# Altium footprint library Intelliclone.PcbLib: 372 footprints (part 16 of 24)
Each footprint in its own frame and in the unit in brackets; x right, y up, seen from the top. Pads: shape width x height; smd on the part's side, far side on the other; paste and mask are expansions set on the pad; w line width, h text height; cw(c..) or ccw(c..) is an arc to the next point about the centre after c.
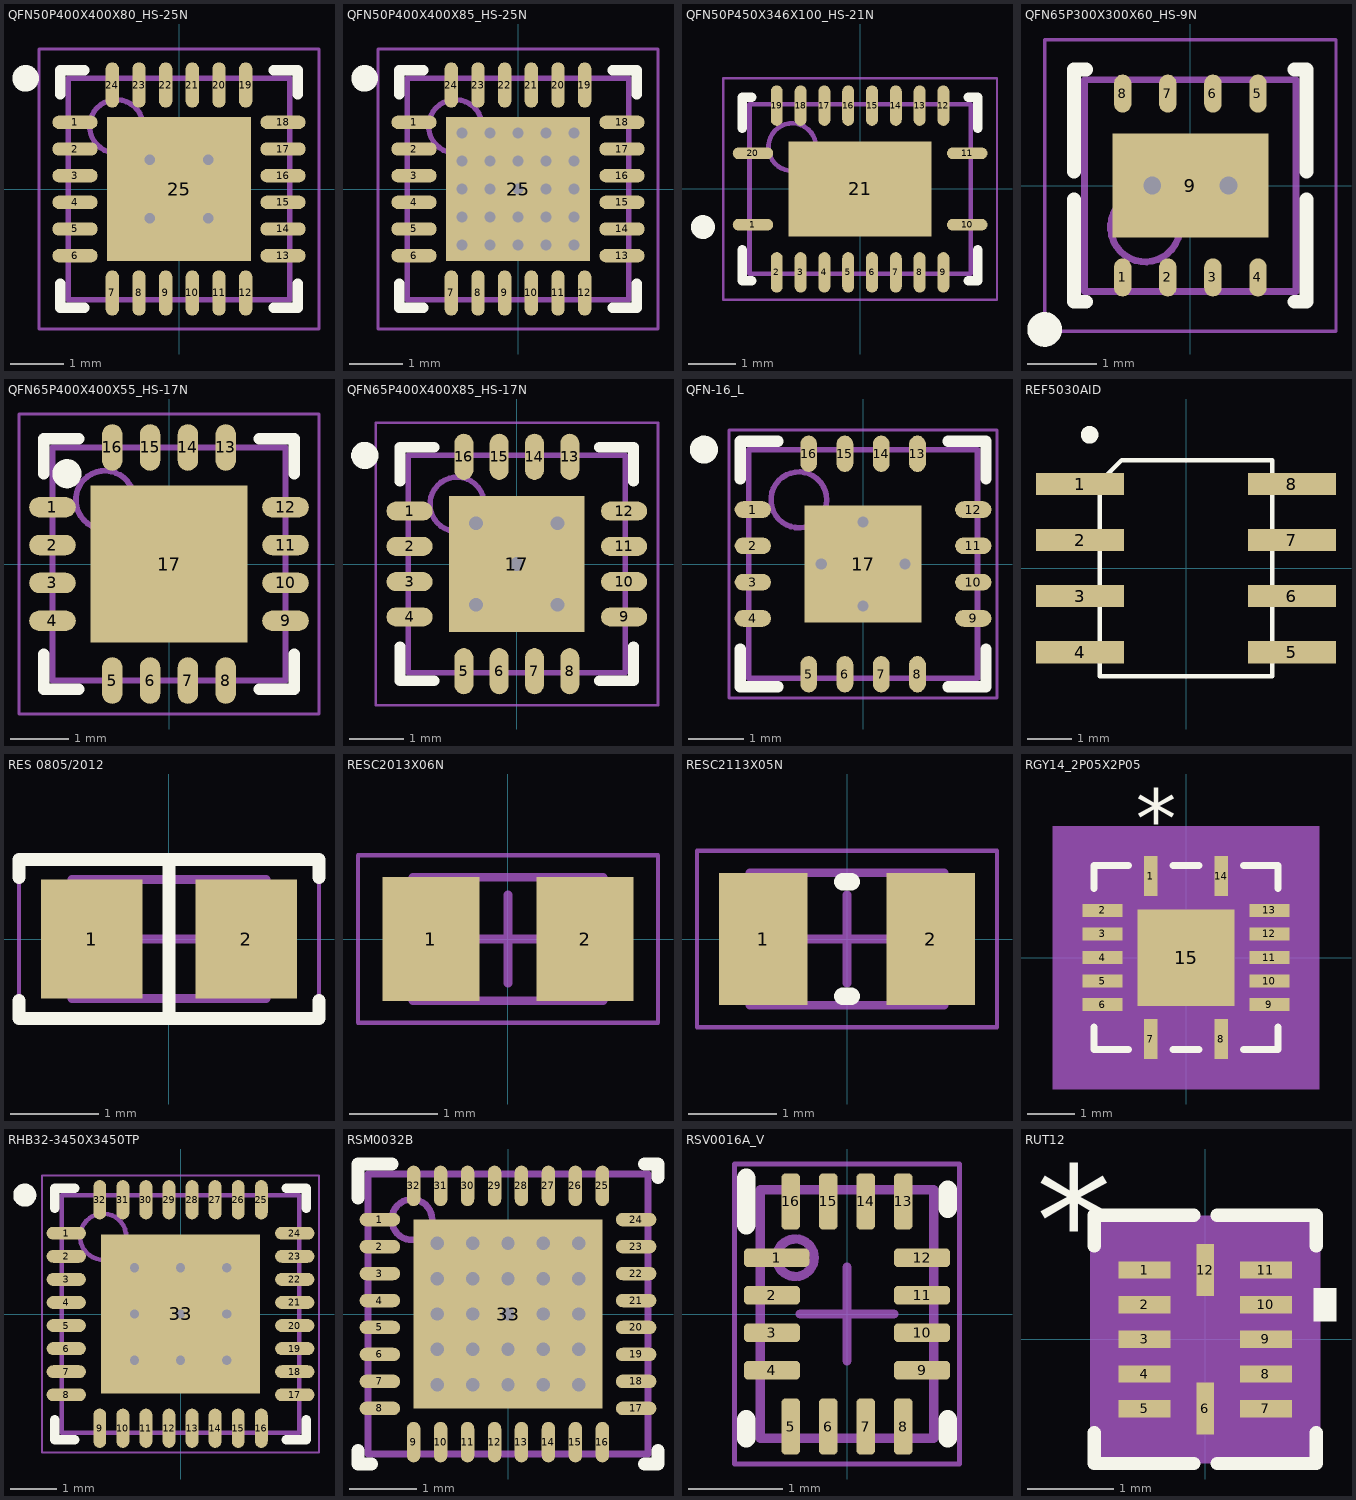
[diagram p15: the footprints below, top view; thin cyan lines are the x and y axes]

## QFN50P400X400X80_HS-25N [mm] "QFN, 24-Leads, Body 4.00x4.00mm, Pitch 0.50mm, Thermal Pad 2.70x2.70mm, IPC Medium Density"
height 0.8
pads (25):
  oval 0.85x0.25 smd: 1(-1.95,1.25) 2(-1.95,0.75) 3(-1.95,0.25) 4(-1.95,-0.25) 5(-1.95,-0.75) 6(-1.95,-1.25) 13(1.95,-1.25) 14(1.95,-0.75) 15(1.95,-0.25) 16(1.95,0.25) 17(1.95,0.75) 18(1.95,1.25)
  oval 0.25x0.85 smd: 7(-1.25,-1.95) 8(-0.75,-1.95) 9(-0.25,-1.95) 10(0.25,-1.95) 11(0.75,-1.95) 12(1.25,-1.95) 19(1.25,1.95) 20(0.75,1.95) 21(0.25,1.95) 22(-0.25,1.95) 23(-0.75,1.95) 24(-1.25,1.95)
  rect 2.7x2.7 smd: 25(0,0)
via 0.55,-0.55 diameter 0.5 hole 0.2
via -0.55,-0.55 diameter 0.5 hole 0.2
via 0.55,0.55 diameter 0.5 hole 0.2
via -0.55,0.55 diameter 0.5 hole 0.2
Top Overlay:
  circle w0.25: c-2.875,2.075 r0.125
  lines w0.2: -2.225,-1.775 -2.225,-2.225 -1.775,-2.225 ; -2.225,1.775 -2.225,2.225 -1.775,2.225 ; 1.775,-2.225 2.225,-2.225 2.225,-1.775 ; 1.775,2.225 2.225,2.225 2.225,1.775
Mechanical 13:
  circle w0.1: c-1.175,1.175 r0.5
  lines w0.1: -2.075,-2.075 2.075,-2.075 2.075,2.075 -2.075,2.075 -2.075,-2.075
Mechanical 15:
  lines w0.05: -2.625,-2.625 2.625,-2.625 2.625,2.625 -2.625,2.625 -2.625,-2.625
  lines w0.1: -0.5,0 0.5,0 ; 0,-0.5 0,0.5
3D body "QFN50P400X400X80_HS-25N.step": height 0.8, standoff 0, extent -2.175,-2.175 2.175,2.175

## QFN50P400X400X85_HS-25N [mm] "QFN, 24-Leads, Body 4.00x4.00mm, Pitch 0.50mm, Thermal Pad 2.70x2.70mm, IPC Medium Density"
height 0.85
pads (25):
  oval 0.85x0.25 smd: 1(-1.95,1.25) 2(-1.95,0.75) 3(-1.95,0.25) 4(-1.95,-0.25) 5(-1.95,-0.75) 6(-1.95,-1.25) 13(1.95,-1.25) 14(1.95,-0.75) 15(1.95,-0.25) 16(1.95,0.25) 17(1.95,0.75) 18(1.95,1.25)
  oval 0.25x0.85 smd: 7(-1.25,-1.95) 8(-0.75,-1.95) 9(-0.25,-1.95) 10(0.25,-1.95) 11(0.75,-1.95) 12(1.25,-1.95) 19(1.25,1.95) 20(0.75,1.95) 21(0.25,1.95) 22(-0.25,1.95) 23(-0.75,1.95) 24(-1.25,1.95)
  rect 2.7x2.7 smd: 25(0,0)
via 0,0 diameter 0.5 hole 0.2
via 0,0.525 diameter 0.5 hole 0.2
via 0,1.05 diameter 0.5 hole 0.2
via 0,-1.05 diameter 0.5 hole 0.2
via 0,-0.525 diameter 0.5 hole 0.2
via -0.525,-0.525 diameter 0.5 hole 0.2
via -0.525,-1.05 diameter 0.5 hole 0.2
via -0.525,1.05 diameter 0.5 hole 0.2
via -0.525,0.525 diameter 0.5 hole 0.2
via -0.525,0 diameter 0.5 hole 0.2
via -1.05,-0.525 diameter 0.5 hole 0.2
via -1.05,-1.05 diameter 0.5 hole 0.2
via -1.05,1.05 diameter 0.5 hole 0.2
via -1.05,0.525 diameter 0.5 hole 0.2
via -1.05,0 diameter 0.5 hole 0.2
via 0.525,-0.525 diameter 0.5 hole 0.2
via 0.525,-1.05 diameter 0.5 hole 0.2
via 0.525,1.05 diameter 0.5 hole 0.2
via 0.525,0.525 diameter 0.5 hole 0.2
via 0.525,0 diameter 0.5 hole 0.2
via 1.05,-0.525 diameter 0.5 hole 0.2
via 1.05,-1.05 diameter 0.5 hole 0.2
via 1.05,1.05 diameter 0.5 hole 0.2
via 1.05,0.525 diameter 0.5 hole 0.2
via 1.05,0 diameter 0.5 hole 0.2
Top Overlay:
  circle w0.25: c-2.875,2.075 r0.125
  lines w0.2: -2.225,-1.775 -2.225,-2.225 -1.775,-2.225 ; -2.225,1.775 -2.225,2.225 -1.775,2.225 ; 1.775,-2.225 2.225,-2.225 2.225,-1.775 ; 1.775,2.225 2.225,2.225 2.225,1.775
Mechanical 13:
  circle w0.1: c-1.175,1.175 r0.5
  lines w0.1: -2.075,-2.075 -2.075,2.075 2.075,2.075 2.075,-2.075 -2.075,-2.075
Mechanical 15:
  lines w0.05: -2.625,-2.625 -2.625,2.625 2.625,2.625 2.625,-2.625 -2.625,-2.625
  lines w0.1: -1.05,-0.5 -1.05,0.5 ; -0.525,-0.5 -0.525,0.5 ; -0.5,0 0.5,0 ; 0,-0.5 0,0.5 ; 0.525,-0.5 0.525,0.5 ; 1.05,-0.5 1.05,0.5
3D body "QFN50P400X400X85_HS-25N.step": height 0.85, standoff 0, extent -2.155,-2.155 2.155,2.155

## QFN50P450X346X100_HS-21N [mm] "QFN, 20-Leads, Body 4.50x3.46mm, Pitch 0.50mm/1.50mm, Thermal Pad 1.60x1.60mm, IPC Medium Density"
height 1
pads (21):
  oval 0.85x0.25 smd: 1(-2.25,-0.75) 10(2.25,-0.75) 11(2.25,0.75) 20(-2.25,0.75)
  oval 0.25x0.85 smd: 2(-1.75,-1.75) 3(-1.25,-1.75) 4(-0.75,-1.75) 5(-0.25,-1.75) 6(0.25,-1.75) 7(0.75,-1.75) 8(1.25,-1.75) 9(1.75,-1.75) 12(1.75,1.75) 13(1.25,1.75) 14(0.75,1.75) 15(0.25,1.75) 16(-0.25,1.75) 17(-0.75,1.75) 18(-1.25,1.75) 19(-1.75,1.75)
  rect 3x2 smd: 21(0,0)
Top Overlay:
  circle w0.25: c-3.3,-0.8 r0.125
  lines w0.2: -2.475,-1.275 -2.475,-1.93 -2.275,-1.93 ; -2.475,1.275 -2.475,1.93 -2.275,1.93 ; 2.275,-1.93 2.475,-1.93 2.475,-1.275 ; 2.275,1.93 2.475,1.93 2.475,1.275
Mechanical 13:
  circle w0.1: c-1.425,0.88 r0.5
  lines w0.1: -2.325,-1.78 2.325,-1.78 2.325,1.78 -2.325,1.78 -2.325,-1.78
Mechanical 15:
  lines w0.05: -2.875,-2.325 2.875,-2.325 2.875,2.325 -2.875,2.325 -2.875,-2.325
  lines w0.1: -0.5,0 0.5,0 ; 0,-0.5 0,0.5
3D body: height 1, standoff 0.08, extent -2.325,-1.78 2.325,1.78

## QFN65P300X300X60_HS-9N [mm] "QFN, 8-Leads, Body 3.00x3.00mm, Pitch 0.65mm, Thermal Pad 1.50x2.25mm, IPC Medium Density"
height 0.6
pads (9):
  oval 0.25x0.55 smd: 1(-0.975,-1.325) 2(-0.325,-1.325) 3(0.325,-1.325) 4(0.975,-1.325) 5(0.975,1.325) 6(0.325,1.325) 7(-0.325,1.325) 8(-0.975,1.325)
  rect 2.25x1.5 smd: 9(0,0)
via -0.55,0 diameter 0.559 hole 0.254
via 0.55,0 diameter 0.559 hole 0.254
Top Overlay:
  circle w0.25: c-2.1,-2.075 r0.125
  lines w0.2: -1.675,-0.2 -1.675,-1.675 -1.5,-1.675 ; -1.675,0.2 -1.675,1.675 -1.5,1.675 ; 1.5,-1.675 1.675,-1.675 1.675,-0.2 ; 1.5,1.675 1.675,1.675 1.675,0.2
Mechanical 13:
  circle w0.1: c-0.65,-0.6 r0.5
  lines w0.1: -1.525,-1.525 -1.525,1.525 1.525,1.525 1.525,-1.525 -1.525,-1.525
Mechanical 15:
  lines w0.05: -2.1,-2.1 -2.1,2.1 2.1,2.1 2.1,-2.1 -2.1,-2.1
  lines w0.1: -0.5,0 0.5,0 ; 0,-0.5 0,0.5
3D body: height 0.6, standoff 0.05, extent -1.525,-1.525 1.525,1.525

## QFN65P400X400X55_HS-17N [mm] "QFN, 16-Leads, Body 4.00x4.00mm, Pitch 0.65mm, Thermal Pad 2.70x2.70mm, IPC Medium Density"
height 0.55
pads (17):
  oval 0.8x0.35 smd: 1(-2,0.975) 2(-2,0.325) 3(-2,-0.325) 4(-2,-0.975) 9(2,-0.975) 10(2,-0.325) 11(2,0.325) 12(2,0.975)
  oval 0.35x0.8 smd: 5(-0.975,-2) 6(-0.325,-2) 7(0.325,-2) 8(0.975,-2) 13(0.975,2) 14(0.325,2) 15(-0.325,2) 16(-0.975,2)
  rect 2.7x2.7 smd: 17(0,0)
Top Overlay:
  circle w0.25: c-1.75,1.55 r0.125
  lines w0.2: -2.15,-1.55 -2.15,-2.15 -1.55,-2.15 ; -2.15,1.55 -2.15,2.15 -1.55,2.15 ; 1.55,-2.15 2.15,-2.15 2.15,-1.55 ; 1.55,2.15 2.15,2.15 2.15,1.55
Mechanical 13:
  circle w0.1: c-1.1,1.1 r0.5
  lines w0.1: -2,-2 2,-2 2,2 -2,2 -2,-2
Mechanical 15:
  lines w0.05: -2.575,-2.575 2.575,-2.575 2.575,2.575 -2.575,2.575 -2.575,-2.575
  lines w0.1: -0.5,0 0.5,0 ; 0,-0.5 0,0.5
3D body "QFN65P400X400X55_HS-17N.step": height 0.55, standoff 0, extent -2.05,-2.05 2.05,2.05

## QFN65P400X400X85_HS-17N [mm] "QFN, 16-Leads, Body 4.00x4.00mm, Pitch 0.65mm, Thermal Pad 2.08x2.08mm, IPC Medium Density"
height 0.85
pads (17):
  oval 0.85x0.35 smd: 1(-1.975,0.975) 2(-1.975,0.325) 3(-1.975,-0.325) 4(-1.975,-0.975) 9(1.975,-0.975) 10(1.975,-0.325) 11(1.975,0.325) 12(1.975,0.975)
  oval 0.35x0.85 smd: 5(-0.975,-1.975) 6(-0.325,-1.975) 7(0.325,-1.975) 8(0.975,-1.975) 13(0.975,1.975) 14(0.325,1.975) 15(-0.325,1.975) 16(-0.975,1.975)
  rect 2.5x2.5 smd paste-1.25: 17(0,0)
via 0,0 diameter 0.559 hole 0.254
via -0.75,0.75 diameter 0.559 hole 0.254
via 0.75,0.75 diameter 0.559 hole 0.254
via -0.75,-0.75 diameter 0.559 hole 0.254
via 0.75,-0.75 diameter 0.559 hole 0.254
Top Overlay:
  circle w0.25: c-2.8,2 r0.125
  lines w0.2: -2.15,-1.525 -2.15,-2.15 -1.525,-2.15 ; -2.15,1.525 -2.15,2.15 -1.525,2.15 ; 1.525,-2.15 2.15,-2.15 2.15,-1.525 ; 1.525,2.15 2.15,2.15 2.15,1.525
Top Paste:
  rectangle: -1.125,-1.1 -0.125,-0.1
  rectangle: 0.1,-1.1 1.1,-0.1
  rectangle: 0.1,0.1 1.1,1.1
  rectangle: -1.125,0.1 -0.125,1.1
Mechanical 13:
  circle w0.1: c-1.1,1.1 r0.5
  lines w0.1: -2,-2 -2,2 2,2 2,-2 -2,-2
Mechanical 15:
  lines w0.05: -2.6,-2.6 -2.6,2.6 2.6,2.6 2.6,-2.6 -2.6,-2.6
  lines w0.1: -0.5,0 0.5,0 ; 0,-0.5 0,0.5
3D body: height 0.85, standoff 0.05, extent -2,-2 2,2

## QFN-16_L [mm] "QFN, 16-Leads, Body 4x4mm, Pitch 0.65mm, Thermal Pad 2.1x2.1mm, IPC High Density"
height 0.8
pads (17):
  oval 0.65x0.3 smd: 1(-1.975,0.975) 2(-1.975,0.325) 3(-1.975,-0.325) 4(-1.975,-0.975) 9(1.975,-0.975) 10(1.975,-0.325) 11(1.975,0.325) 12(1.975,0.975)
  oval 0.3x0.65 smd: 5(-0.975,-1.975) 6(-0.325,-1.975) 7(0.325,-1.975) 8(0.975,-1.975) 13(0.975,1.975) 14(0.325,1.975) 15(-0.325,1.975) 16(-0.975,1.975)
  rect 2.1x2.1 smd paste-1.05: 17(0,0)
via 0.75,0 diameter 0.5 hole 0.2
via -0.75,0 diameter 0.5 hole 0.2
via 0,0.75 diameter 0.5 hole 0.2
via 0,-0.75 diameter 0.5 hole 0.2
Top Overlay:
  circle w0.25: c-2.85,2.05 r0.125
  lines w0.2: -2.2,-1.525 -2.2,-2.2 -1.525,-2.2 ; -2.2,1.525 -2.2,2.2 -1.525,2.2 ; 1.525,-2.2 2.2,-2.2 2.2,-1.525 ; 1.525,2.2 2.2,2.2 2.2,1.525
Top Paste:
  rectangle: -0.95,-0.95 0.95,0.95
Mechanical 13:
  circle w0.1: c-1.15,1.15 r0.5
  lines w0.1: -2.05,-2.05 2.05,-2.05 2.05,2.05 -2.05,2.05 -2.05,-2.05
Mechanical 15:
  lines w0.05: -2.4,-2.4 2.4,-2.4 2.4,2.4 -2.4,2.4 -2.4,-2.4
  lines w0.1: -0.5,0 0.5,0 ; 0,-0.5 0,0.5
3D body: height 0.8, standoff 0, extent -2.05,-2.05 2.05,2.05

## REF5030AID [mil]
pads (8):
  rect 78.7x19.7 smd: 1(-94.5,75) 2(-94.5,25) 3(-94.5,-25) 4(-94.5,-75) 5(94.5,-75) 6(94.5,-25) 7(94.5,25) 8(94.5,75)
Top Overlay:
  circle w10: c-86,119 r2.83
  lines w4.02: -77,-96.5 -77,76.8 -57.3,96.5 77,96.5 77,-96.5 -77,-96.5
3D body: height 57, standoff 4, extent -77,-97 77,97

## RES 0805/2012 [mm] "Chip Resistor, 2-Leads, Body 2.00x1.25mm, IPC Medium Density"
height 0.7
pads (2):
  rect 1.15x1.35 smd: 1(-0.875,0) 2(0.875,0)
Top Overlay:
  lines w0.15: -1.7,-0.7 -1.7,-0.9 1.7,-0.9 1.7,-0.7 ; -1.7,0.7 -1.7,0.9 1.7,0.9 1.7,0.7 ; 0,-0.9 0,0.9
Mechanical 13:
  lines w0.1: -1.1,-0.675 -1.1,0.675 1.1,0.675 1.1,-0.675 -1.1,-0.675
Mechanical 15:
  lines w0.05: -1.7,-0.95 -1.7,0.95 1.7,0.95 1.7,-0.95 -1.7,-0.95
  lines w0.1: -0.5,0 0.5,0 ; 0,-0.5 0,0.5
3D body "0805 resistor.STEP": height 0.6, standoff 0, extent -0.95,-0.625 1.05,0.625

## RESC2013X06N [mm] "Chip Resistor, 2-Leads, Body 2.00x1.27mm, IPC Medium Density"
height 0.65
pads (2):
  rect 1.1x1.4 smd: 1(-0.875,0) 2(0.875,0)
Mechanical 13:
  lines w0.1: -1.075,-0.7 -1.075,0.7 1.075,0.7 1.075,-0.7 -1.075,-0.7
Mechanical 15:
  lines w0.05: -1.7,-0.95 -1.7,0.95 1.7,0.95 1.7,-0.95 -1.7,-0.95
  lines w0.1: -0.5,0 0.5,0 ; 0,-0.5 0,0.5
3D body "RESC2013X06N.step": height 0.65, standoff 0, extent -1.075,-0.7 1.075,0.7

## RESC2113X05N [mm] "Chip Resistor, 2-Leads, Body 2.10x1.35mm, IPC Medium Density"
height 0.5
pads (2):
  rect 1x1.5 smd: 1(-0.95,0) 2(0.95,0)
Top Overlay:
  lines w0.2: -0.05,-0.65 0.05,-0.65 ; -0.05,0.65 0.05,0.65
Mechanical 13:
  lines w0.1: -1.1,-0.75 1.1,-0.75 1.1,0.75 -1.1,0.75 -1.1,-0.75
Mechanical 15:
  lines w0.05: -1.7,-1 1.7,-1 1.7,1 -1.7,1 -1.7,-1
  lines w0.1: -0.5,0 0.5,0 ; 0,-0.5 0,0.5
3D body: height 0.5, standoff 0, extent 0.72,-0.75 1.1,0.75
3D body: height 0.5, standoff 0, extent -1.1,-0.75 -0.72,0.75
3D body: height 0.5, standoff 0, extent -0.72,-0.75 0.72,0.75

## RGY14_2P05X2P05 [mm] "14-VQFN"
pads (15):
  rect 0.28x0.85 smd: 1(-0.75,1.731) 7(-0.75,-1.731) 8(0.75,-1.731) 14(0.75,1.731)
  rect 0.85x0.28 smd: 2(-1.769,1) 3(-1.769,0.5) 4(-1.769,0) 5(-1.769,-0.5) 6(-1.769,-1) 9(1.769,-1) 10(1.769,-0.5) 11(1.769,0) 12(1.769,0.5) 13(1.769,1)
  rect 2.05x2.05 smd: 15(0,0)
Top Overlay:
  lines w0.152: -1.952,-1.473 -1.952,-1.952 -1.223,-1.952 ; -1.952,1.473 -1.952,1.952 -1.223,1.952 ; -0.277,-1.952 0.277,-1.952 ; -0.277,1.952 0.277,1.952 ; 1.223,-1.952 1.952,-1.952 1.952,-1.473 ; 1.223,1.952 1.952,1.952 1.952,1.473
  text "*" at -1.068,2.308 h1.27
Top Paste:
  region: 0.95,-0.494 0.635,-0.494 0.494,-0.635 0.494,-0.95 0.95,-0.95
  region: 0.95,0.294 0.635,0.294 0.494,0.152 0.494,-0.152 0.635,-0.294 0.95,-0.294
  region: 0.95,0.95 0.494,0.95 0.494,0.635 0.635,0.494 0.95,0.494
  region: 0.152,-0.494 -0.152,-0.494 -0.294,-0.635 -0.294,-0.95 0.294,-0.95 0.294,-0.635
  region: 0.95,0.95 -0.95,0.95 -0.95,-0.95 0.95,-0.95
  region: 0.294,0.95 -0.294,0.95 -0.294,0.635 -0.152,0.494 0.152,0.494 0.294,0.635
  region: -0.635,-0.494 -0.95,-0.494 -0.95,-0.95 -0.494,-0.95 -0.494,-0.635
  region: -0.635,0.294 -0.95,0.294 -0.95,-0.294 -0.635,-0.294 -0.494,-0.152 -0.494,0.152
  region: -0.494,0.95 -0.95,0.95 -0.95,0.494 -0.635,0.494 -0.494,0.635
  region: 0,-1.025
  region: 0,-1.025
  region: 0,1.025
  region: 0,1.025
  region: -0.661,2.105 -0.839,2.105 -0.839,1.357 -0.661,1.357
  region: 0.839,2.105 0.661,2.105 0.661,1.357 0.839,1.357
  region: 2.143,1.089 1.395,1.089 1.395,0.911 2.143,0.911
  region: 2.143,0.589 1.395,0.589 1.395,0.411 2.143,0.411
  region: 2.143,0.089 1.395,0.089 1.395,-0.089 2.143,-0.089
  region: 2.143,-0.411 1.395,-0.411 1.395,-0.589 2.143,-0.589
  region: 2.143,-0.911 1.395,-0.911 1.395,-1.089 2.143,-1.089
  region: 0.839,-1.357 0.661,-1.357 0.661,-2.105 0.839,-2.105
  region: -0.661,-1.357 -0.839,-1.357 -0.839,-2.105 -0.661,-2.105
  region: -1.395,-0.911 -2.143,-0.911 -2.143,-1.089 -1.395,-1.089
  region: -1.395,-0.411 -2.143,-0.411 -2.143,-0.589 -1.395,-0.589
  region: -1.395,0.089 -2.143,0.089 -2.143,-0.089 -1.395,-0.089
  region: -1.395,0.589 -2.143,0.589 -2.143,0.411 -1.395,0.411
  region: -1.395,1.089 -2.143,1.089 -2.143,0.911 -1.395,0.911
Top Solder:
  region: 0.594,-1.088 0.594,1.088 1.088,1.088 1.088,-1.088
  region: 1.088,-1.089 1.088,1.088 -1.089,1.088 -1.089,-1.088
  region: -1.088,-1.088 -1.088,1.088 -0.594,1.088 -0.594,-1.088
  region: -1.088,-1.088 -1.088,-0.594 1.088,-0.594 1.088,-1.088
  region: -1.088,-0.194 -1.088,0.194 1.088,0.194 1.088,-0.194
  region: -1.088,0.594 -1.088,1.088 1.088,1.088 1.088,0.594
  region: 0,-1.025
  region: 0,-1.025
  region: 0,1.025
  region: 0,1.025
  region: -0.54,2.226 -0.96,2.226 -0.96,1.236 -0.54,1.236
  region: 0.96,2.226 0.54,2.226 0.54,1.236 0.96,1.236
  region: 2.264,1.21 1.274,1.21 1.274,0.79 2.264,0.79
  region: 2.264,0.71 1.274,0.71 1.274,0.29 2.264,0.29
  region: 2.264,0.21 1.274,0.21 1.274,-0.21 2.264,-0.21
  region: 2.264,-0.29 1.274,-0.29 1.274,-0.71 2.264,-0.71
  region: 2.264,-0.79 1.274,-0.79 1.274,-1.21 2.264,-1.21
  region: 0.96,-1.236 0.54,-1.236 0.54,-2.226 0.96,-2.226
  region: -0.54,-1.236 -0.96,-1.236 -0.96,-2.226 -0.54,-2.226
  region: -1.274,-0.79 -2.264,-0.79 -2.264,-1.21 -1.274,-1.21
  region: -1.274,-0.29 -2.264,-0.29 -2.264,-0.71 -1.274,-0.71
  region: -1.274,0.21 -2.264,0.21 -2.264,-0.21 -1.274,-0.21
  region: -1.274,0.71 -2.264,0.71 -2.264,0.29 -1.274,0.29
  region: -1.274,1.21 -2.264,1.21 -2.264,0.79 -1.274,0.79
Mechanical 5:
  region: 2.829,-2.791 -2.829,-2.791 -2.829,2.791 2.829,2.791
Mechanical 13:
  lines w0.025: -1.825,0.555 -0.555,1.825 ; -1.825,-1.825 -1.825,1.825 1.825,1.825 1.825,-1.825 -1.825,-1.825
  text "*" at -1.068,0.671 h1.27
Mechanical 15:
  region: 2.448,-2.41 -2.448,-2.41 -2.448,2.41 2.448,2.41
  lines w0.152: -2.448,-2.41 2.448,-2.41 2.448,2.41 -2.448,2.41 -2.448,-2.41
Mechanical 16:
  circle w0.127: c0.394,0.394 r0.191
  circle w0.127: c0.394,-0.394 r0.191
  circle w0.127: c-0.394,0.394 r0.191
  circle w0.127: c-0.394,-0.394 r0.191
3D body "RGY14_2P05X2P05.step": height 1, standoff 0, extent -1.876,-1.876 1.876,1.876
3D body: height 0.25, standoff 0, extent 0,0 0.254,0.254

## RHB32-3450X3450TP [mm] "QFN, 32-Leads, Body 5x5mm, Pitch 0.5mm, Thermal Pad 3.45x3.45mm, TI Recommended"
height 1
pads (33):
  oval 0.85x0.28 smd paste-0.025 mask+0.07: 1(-2.475,1.75) 2(-2.475,1.25) 3(-2.475,0.75) 4(-2.475,0.25) 5(-2.475,-0.25) 6(-2.475,-0.75) 7(-2.475,-1.25) 8(-2.475,-1.75) 17(2.475,-1.75) 18(2.475,-1.25) 19(2.475,-0.75) 20(2.475,-0.25) 21(2.475,0.25) 22(2.475,0.75) 23(2.475,1.25) 24(2.475,1.75)
  oval 0.28x0.85 smd paste-0.025 mask+0.07: 9(-1.75,-2.475) 10(-1.25,-2.475) 11(-0.75,-2.475) 12(-0.25,-2.475) 13(0.25,-2.475) 14(0.75,-2.475) 15(1.25,-2.475) 16(1.75,-2.475) 25(1.75,2.475) 26(1.25,2.475) 27(0.75,2.475) 28(0.25,2.475) 29(-0.25,2.475) 30(-0.75,2.475) 31(-1.25,2.475) 32(-1.75,2.475)
  rect 3.45x3.45 smd paste-1.725 mask+0.07: 33(0,0)
via 1,-1 diameter 0.5 hole 0.2
via 0,-1 diameter 0.5 hole 0.2
via -1,-1 diameter 0.5 hole 0.2
via 1,0 diameter 0.5 hole 0.2
via 0,0 diameter 0.5 hole 0.2
via -1,0 diameter 0.5 hole 0.2
via 1,1 diameter 0.5 hole 0.2
via 0,1 diameter 0.5 hole 0.2
via -1,1 diameter 0.5 hole 0.2
Top Overlay:
  circle w0.25: c-3.375,2.575 r0.125
  lines w0.2: -2.725,-2.29 -2.725,-2.725 -2.29,-2.725 ; -2.725,2.29 -2.725,2.725 -2.29,2.725 ; 2.29,-2.725 2.725,-2.725 2.725,-2.29 ; 2.29,2.725 2.725,2.725 2.725,2.29
Top Paste:
  region: -0.15,-0.15 -1.6,-0.15 -1.6,-1.6 -0.15,-1.6
  rectangle: 0.15,-1.6 1.6,-0.15
  rectangle: 0.15,0.15 1.6,1.6
  region: -0.15,1.6 -1.6,1.6 -1.6,0.15 -0.15,0.15
Mechanical 13:
  circle w0.1: c-1.675,1.675 r0.5
  lines w0.1: -2.575,-2.575 2.575,-2.575 2.575,2.575 -2.575,2.575 -2.575,-2.575
Mechanical 15:
  lines w0.05: -3,-3 3,-3 3,3 -3,3 -3,-3
  lines w0.1: -0.5,0 0.5,0 ; 0,-0.5 0,0.5
3D body: height 1, standoff 0, extent -2.575,-2.575 2.575,2.575

## RSM0032B [mm]
height 1
pads (33):
  oval 0.6x0.2 smd paste+0 mask+0.051: 1(-1.9,1.4) 2(-1.9,1) 3(-1.9,0.6) 4(-1.9,0.2) 5(-1.9,-0.2) 6(-1.9,-0.6) 7(-1.9,-1) 8(-1.9,-1.4) 17(1.9,-1.4) 18(1.9,-1) 19(1.9,-0.6) 20(1.9,-0.2) 21(1.9,0.2) 22(1.9,0.6) 23(1.9,1) 24(1.9,1.4)
  oval 0.2x0.6 smd paste+0 mask+0.051: 9(-1.4,-1.9) 10(-1,-1.9) 11(-0.6,-1.9) 12(-0.2,-1.9) 13(0.2,-1.9) 14(0.6,-1.9) 15(1,-1.9) 16(1.4,-1.9) 25(1.4,1.9) 26(1,1.9) 27(0.6,1.9) 28(0.2,1.9) 29(-0.2,1.9) 30(-0.6,1.9) 31(-1,1.9) 32(-1.4,1.9)
  rect 2.8x2.8 smd paste-1.387 mask+0.051: 33(0,0)
via 1.05,0 diameter 0.5 hole 0.2
via 1.05,0.525 diameter 0.5 hole 0.2
via 1.05,1.05 diameter 0.5 hole 0.2
via 1.05,-1.05 diameter 0.5 hole 0.2
via 1.05,-0.525 diameter 0.5 hole 0.2
via 0.525,0 diameter 0.5 hole 0.2
via 0.525,0.525 diameter 0.5 hole 0.2
via 0.525,1.05 diameter 0.5 hole 0.2
via 0.525,-1.05 diameter 0.5 hole 0.2
via 0.525,-0.525 diameter 0.5 hole 0.2
via -1.05,0 diameter 0.5 hole 0.2
via -1.05,0.525 diameter 0.5 hole 0.2
via -1.05,1.05 diameter 0.5 hole 0.2
via -1.05,-1.05 diameter 0.5 hole 0.2
via -1.05,-0.525 diameter 0.5 hole 0.2
via -0.525,0 diameter 0.5 hole 0.2
via -0.525,0.525 diameter 0.5 hole 0.2
via -0.525,1.05 diameter 0.5 hole 0.2
via -0.525,-1.05 diameter 0.5 hole 0.2
via -0.525,-0.525 diameter 0.5 hole 0.2
via 0,-0.525 diameter 0.5 hole 0.2
via 0,-1.05 diameter 0.5 hole 0.2
via 0,1.05 diameter 0.5 hole 0.2
via 0,0.525 diameter 0.5 hole 0.2
via 0,0 diameter 0.5 hole 0.2
Top Overlay:
  lines w0.2: -2.225,-2.025 -2.225,-2.225 -2.025,-2.225 ; -2.225,1.725 -2.225,2.225 -1.725,2.225 ; 2.025,-2.225 2.225,-2.225 2.225,-2.025 ; 2.025,2.225 2.225,2.225 2.225,2.025
Top Paste:
  region: 0.1,-1.329 1.329,-1.329 1.329,-0.1 0.1,-0.1
  region: -1.329,-1.329 -0.1,-1.329 -0.1,-0.1 -1.329,-0.1
  region: 0.1,0.1 1.329,0.1 1.329,1.329 0.1,1.329
  region: -1.329,0.1 -0.1,0.1 -0.1,1.329 -1.329,1.329
Mechanical 13:
  circle w0.1: c-1.425,1.4 r0.3
  lines w0.1: -2.075,-2.075 2.075,-2.075 2.075,2.075 -2.075,2.075 -2.075,-2.075
3D body "QFN50P400X400X85_HS-25N.step": height 0.85, standoff 0, extent -2.155,-2.155 2.155,2.155

## RSV0016A_V [mm] "QFN, 16-Leads, Body 1.8x2.6mm, Pitch 0.4mm, TI Recommended"
height 0.55
pads (16):
  rrect50% 0.7x0.2 smd: 1(-0.75,0.6)
  rrect50% 0.6x0.2 smd: 2(-0.8,0.2) 3(-0.8,-0.2) 4(-0.8,-0.6) 9(0.8,-0.6) 10(0.8,-0.2) 11(0.8,0.2) 12(0.8,0.6)
  rrect50% 0.2x0.6 smd: 5(-0.6,-1.2) 6(-0.2,-1.2) 7(0.2,-1.2) 8(0.6,-1.2) 13(0.6,1.2) 14(0.2,1.2) 15(-0.2,1.2) 16(-0.6,1.2)
Top Overlay:
  lines w0.2: -1.075,-1.325 -1.075,-1.125 ; -1.075,0.95 -1.075,1.45 ; 1.075,-1.325 1.075,-1.125 ; 1.075,1.125 1.075,1.325
Mechanical 13:
  circle w0.1: c-0.55,0.6 r0.2
  lines w0.1: -0.925,-1.325 -0.925,1.325 0.925,1.325 0.925,-1.325 -0.925,-1.325
Mechanical 15:
  lines w0.05: -1.2,-1.6 1.2,-1.6 1.2,1.6 -1.2,1.6 -1.2,-1.6
  lines w0.1: -0.5,0 0.5,0 ; 0,-0.5 0,0.5
3D body: height 0.55, standoff 0, extent -0.925,-1.325 0.925,1.325
3D body: height 0.56, standoff 0.4, extent -0.749,0.401 -0.351,0.799

## RUT12 [mm]
pads (12):
  rect 0.6x0.2 smd paste-0.1 mask+0: 1(-0.7,0.8) 2(-0.7,0.4) 3(-0.7,0) 4(-0.7,-0.4) 5(-0.7,-0.8) 7(0.7,-0.8) 8(0.7,-0.4) 9(0.7,0) 10(0.7,0.4) 11(0.7,0.8)
  rect 0.2x0.6 smd paste-0.1 mask+0: 6(0,-0.8) 12(0,0.8)
Top Overlay:
  region: 1.254,0.59 1.508,0.59 1.508,0.209 1.254,0.209
  lines w0.152: -1.281,-1.078 -1.281,-1.431 -0.134,-1.431 ; -1.281,1.078 -1.281,1.431 -0.134,1.431 ; 0.134,-1.431 1.281,-1.431 1.281,-1.078 ; 0.134,1.431 1.281,1.431 1.281,1.078
  text "*" at -1.953,0.746 h1.27
Top Paste:
  region: -0.425,0.875 -0.975,0.875 -0.975,0.725 -0.425,0.725
  region: -0.425,0.475 -0.975,0.475 -0.975,0.325 -0.425,0.325
  region: -0.425,0.075 -0.975,0.075 -0.975,-0.075 -0.425,-0.075
  region: -0.425,-0.325 -0.975,-0.325 -0.975,-0.475 -0.425,-0.475
  region: -0.425,-0.725 -0.975,-0.725 -0.975,-0.875 -0.425,-0.875
  region: 0.075,-0.525 -0.075,-0.525 -0.075,-1.075 0.075,-1.075
  region: 0.975,-0.725 0.425,-0.725 0.425,-0.875 0.975,-0.875
  region: 0.975,-0.325 0.425,-0.325 0.425,-0.475 0.975,-0.475
  region: 0.975,0.075 0.425,0.075 0.425,-0.075 0.975,-0.075
  region: 0.975,0.475 0.425,0.475 0.425,0.325 0.975,0.325
  region: 0.975,0.875 0.425,0.875 0.425,0.725 0.975,0.725
  region: 0.075,1.075 -0.075,1.075 -0.075,0.525 0.075,0.525
Top Solder:
  region: -0.35,0.95 -1.05,0.95 -1.05,0.65 -0.35,0.65
  region: -0.35,0.55 -1.05,0.55 -1.05,0.25 -0.35,0.25
  region: -0.35,0.15 -1.05,0.15 -1.05,-0.15 -0.35,-0.15
  region: -0.35,-0.25 -1.05,-0.25 -1.05,-0.55 -0.35,-0.55
  region: -0.35,-0.65 -1.05,-0.65 -1.05,-0.95 -0.35,-0.95
  region: 0.15,-0.45 -0.15,-0.45 -0.15,-1.15 0.15,-1.15
  region: 1.05,-0.65 0.35,-0.65 0.35,-0.95 1.05,-0.95
  region: 1.05,-0.25 0.35,-0.25 0.35,-0.55 1.05,-0.55
  region: 1.05,0.15 0.35,0.15 0.35,-0.15 1.05,-0.15
  region: 1.05,0.55 0.35,0.55 0.35,0.25 1.05,0.25
  region: 1.05,0.95 0.35,0.95 0.35,0.65 1.05,0.65
  region: 0.15,1.15 -0.15,1.15 -0.15,0.45 0.15,0.45
Mechanical 13:
  lines w0.025: -0.9,-0.22 0.37,1.05 ; -0.9,-1.05 0.9,-1.05 0.9,1.05 -0.9,1.05 -0.9,-1.05
  text "*" at -0.463,0.365 h1.27
Mechanical 15:
  region: -0.354,-1.304 -1.154,-1.304 -1.154,-1.154 -1.254,-1.154 -1.254,1.154 -1.154,1.154 -1.154,1.304 -0.354,1.304 -0.354,1.354 0.354,1.354 0.354,1.304 1.154,1.304 1.154,1.154 1.254,1.154 1.254,-1.154 1.154,-1.154 1.154,-1.304 0.354,-1.304 0.354,-1.354 -0.354,-1.354
  lines w0.152: -1.254,-1.154 -1.154,-1.154 -1.154,-1.304 -0.354,-1.304 -0.354,-1.354 0.354,-1.354 0.354,-1.304 1.154,-1.304 1.154,-1.154 1.254,-1.154 1.254,1.154 1.154,1.154 1.154,1.304 0.354,1.304 0.354,1.354 -0.354,1.354 -0.354,1.304 -1.154,1.304 -1.154,1.154 -1.254,1.154 -1.254,-1.154
3D body: height 0.25, standoff 0, extent 0,0 0.254,0.254